# Altium footprint library Molex FFC - FPC Connectors (SMT).PcbLib: 638 footprints (part 26 of 40)
Each footprint in its own frame and in the unit in brackets; x right, y up, seen from the top. Pads: shape width x height; smd on the part's side, far side on the other; paste and mask are expansions set on the pad; w line width, h text height; cw(c..) or ccw(c..) is an arc to the next point about the centre after c.
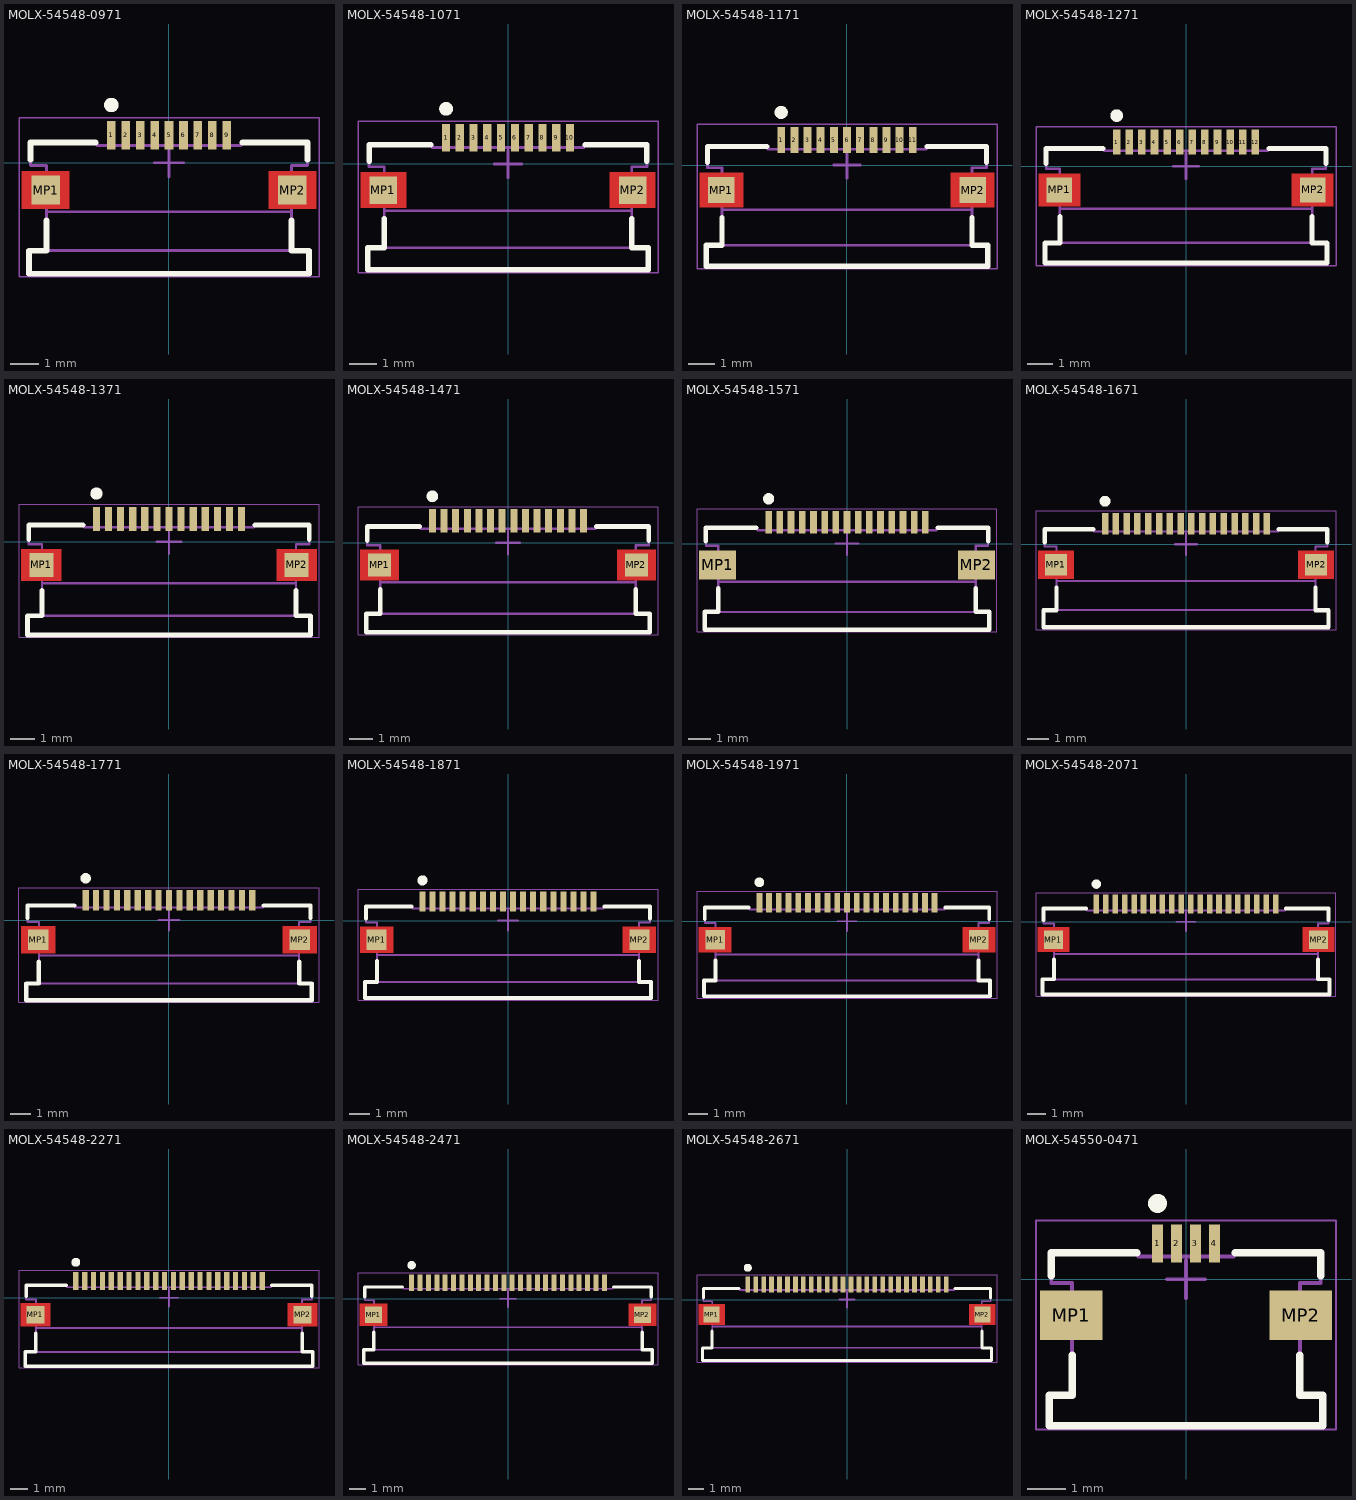
[diagram p25: the footprints below, top view; thin cyan lines are the x and y axes]

## MOLX-54548-0971 [mm] "FPC Connector, 9-Leads, Right Angle, Pitch 0.5 mm, Mated Height 1.2 mm, SMT"
height 1.212
pads (11):
  rect 0.3x1 smd: 1(-2,0.95) 2(-1.5,0.95) 3(-1,0.95) 4(-0.5,0.95) 5(0,0.95) 6(0.5,0.95) 7(1,0.95) 8(1.5,0.95) 9(2,0.95)
  rect 1x1 smd: MP1(-4.275,-0.95) MP2(4.275,-0.95)
Top Layer:
  region: -5.1,-0.3 -3.45,-0.3 -3.45,-1.6 -5.1,-1.6
  region: 5.1,-0.3 3.45,-0.3 3.45,-1.6 5.1,-1.6
Top Overlay:
  circle w0.25: c-2,2 r0.125
  lines w0.2: -4.8,0.1 -4.8,0.7 -2.55,0.7 ; -4.25,-2 -4.25,-3.05 -4.85,-3.05 -4.85,-3.849 4.85,-3.849 4.85,-3.05 4.25,-3.05 4.25,-2 ; 2.55,0.7 4.8,0.7 4.8,0.1
Mechanical 13:
  lines w0.1: -4.25,-1.7 4.25,-1.7 ; -4.25,-3.05 -4.25,-0.1 -4.8,-0.1 -4.8,0.7 -2.5,0.7 -2.5,0.6 2.5,0.6 2.5,0.7 4.8,0.7 4.8,-0.1 4.25,-0.1 4.25,-3.05 ; -4.25,-3.05 -4.85,-3.05 -4.85,-3.849 4.85,-3.849 4.85,-3.05 4.25,-3.05 ; -4.25,-3.05 4.25,-3.05
Mechanical 15:
  lines w0.05: -5.2,-3.949 5.2,-3.949 5.2,1.55 -5.2,1.55 -5.2,-3.949
  lines w0.1: -0.5,0 0.5,0 ; 0,-0.5 0,0.5
3D body: height 0.25, standoff 0, extent -4.85,-3.849 4.85,1.151

## MOLX-54548-1071 [mm] "FPC Connector, 10-Leads, Right Angle, Pitch 0.5 mm, Mated Height 1.2 mm, SMT"
height 1.212
pads (12):
  rect 0.3x1 smd: 1(-2.25,0.95) 2(-1.75,0.95) 3(-1.25,0.95) 4(-0.75,0.95) 5(-0.25,0.95) 6(0.25,0.95) 7(0.75,0.95) 8(1.25,0.95) 9(1.75,0.95) 10(2.25,0.95)
  rect 1x1 smd: MP1(-4.525,-0.95) MP2(4.525,-0.95)
Top Layer:
  region: -5.35,-0.3 -3.7,-0.3 -3.7,-1.6 -5.35,-1.6
  region: 5.35,-0.3 3.7,-0.3 3.7,-1.6 5.35,-1.6
Top Overlay:
  circle w0.25: c-2.25,2 r0.125
  lines w0.2: -5.05,0.1 -5.05,0.7 -2.8,0.7 ; -4.5,-2 -4.5,-3.05 -5.1,-3.05 -5.1,-3.849 5.1,-3.849 5.1,-3.05 4.5,-3.05 4.5,-2 ; 2.8,0.7 5.05,0.7 5.05,0.1
Mechanical 13:
  lines w0.1: -4.5,-1.7 4.5,-1.7 ; -4.5,-3.05 4.5,-3.05 ; -4.5,-3.05 -5.1,-3.05 -5.1,-3.849 5.1,-3.849 5.1,-3.05 4.5,-3.05 ; -4.5,-3.05 -4.5,-0.1 -5.05,-0.1 -5.05,0.7 -2.75,0.7 -2.75,0.6 2.75,0.6 2.75,0.7 5.05,0.7 5.05,-0.1 4.5,-0.1 4.5,-3.05
Mechanical 15:
  lines w0.05: -5.45,-3.949 -5.45,1.55 5.45,1.55 5.45,-3.949 -5.45,-3.949
  lines w0.1: -0.5,0 0.5,0 ; 0,-0.5 0,0.5
3D body: height 0.25, standoff 0, extent -5.1,-3.85 5.1,1.15

## MOLX-54548-1171 [mm] "FPC Connector, 11-Leads, Right Angle, Pitch 0.5 mm, Mated Height 1.2 mm, SMT"
height 1.212
pads (13):
  rect 0.3x1 smd: 1(-2.5,0.95) 2(-2,0.95) 3(-1.5,0.95) 4(-1,0.95) 5(-0.5,0.95) 6(0,0.95) 7(0.5,0.95) 8(1,0.95) 9(1.5,0.95) 10(2,0.95) 11(2.5,0.95)
  rect 1x1 smd: MP1(-4.775,-0.95) MP2(4.775,-0.95)
Top Layer:
  region: 5.6,-0.3 3.95,-0.3 3.95,-1.6 5.6,-1.6
  region: -5.6,-0.3 -3.95,-0.3 -3.95,-1.6 -5.6,-1.6
Top Overlay:
  circle w0.25: c-2.5,2 r0.125
  lines w0.2: -5.3,0.1 -5.3,0.7 -3.05,0.7 ; -4.75,-2 -4.75,-3.05 -5.35,-3.05 -5.35,-3.849 5.35,-3.849 5.35,-3.05 4.75,-3.05 4.75,-2 ; 3.05,0.7 5.3,0.7 5.3,0.1
Mechanical 13:
  lines w0.1: -4.75,-1.7 4.75,-1.7 ; -4.75,-3.05 4.75,-3.05 ; -4.75,-3.05 -5.35,-3.05 -5.35,-3.849 5.35,-3.849 5.35,-3.05 4.75,-3.05 ; -4.75,-3.05 -4.75,-0.1 -5.3,-0.1 -5.3,0.7 -3,0.7 -3,0.6 3,0.6 3,0.7 5.3,0.7 5.3,-0.1 4.75,-0.1 4.75,-3.05
Mechanical 15:
  lines w0.05: -5.7,-3.949 -5.7,1.55 5.7,1.55 5.7,-3.949 -5.7,-3.949
  lines w0.1: -0.5,0 0.5,0 ; 0,-0.5 0,0.5
3D body: height 0.25, standoff 0, extent -5.35,-3.849 5.35,1.151

## MOLX-54548-1271 [mm] "FPC Connector, 12-Leads, Right Angle, Pitch 0.5 mm, Mated Height 1.2 mm, SMT"
height 1.212
pads (14):
  rect 0.3x1 smd: 1(-2.75,0.95) 2(-2.25,0.95) 3(-1.75,0.95) 4(-1.25,0.95) 5(-0.75,0.95) 6(-0.25,0.95) 7(0.25,0.95) 8(0.75,0.95) 9(1.25,0.95) 10(1.75,0.95) 11(2.25,0.95) 12(2.75,0.95)
  rect 1x1 smd: MP1(-5.025,-0.95) MP2(5.025,-0.95)
Top Layer:
  region: 5.85,-0.3 4.2,-0.3 4.2,-1.6 5.85,-1.6
  region: -5.85,-0.3 -4.2,-0.3 -4.2,-1.6 -5.85,-1.6
Top Overlay:
  circle w0.25: c-2.75,2 r0.125
  lines w0.2: -5.55,0.1 -5.55,0.7 -3.3,0.7 ; -5,-2 -5,-3.05 -5.6,-3.05 -5.6,-3.849 5.6,-3.849 5.6,-3.05 5,-3.05 5,-2 ; 3.3,0.7 5.55,0.7 5.55,0.1
Mechanical 13:
  lines w0.1: -5,-1.7 5,-1.7 ; -5,-3.05 -5,-0.1 -5.55,-0.1 -5.55,0.7 -3.25,0.7 -3.25,0.6 3.25,0.6 3.25,0.7 5.55,0.7 5.55,-0.1 5,-0.1 5,-3.05 ; -5,-3.05 -5.6,-3.05 -5.6,-3.849 5.6,-3.849 5.6,-3.05 5,-3.05 ; -5,-3.05 5,-3.05
Mechanical 15:
  lines w0.05: -5.95,-3.949 5.95,-3.949 5.95,1.55 -5.95,1.55 -5.95,-3.949
  lines w0.1: -0.5,0 0.5,0 ; 0,-0.5 0,0.5
3D body: height 0.25, standoff 0, extent -5.6,-3.85 5.6,1.15

## MOLX-54548-1371 [mm] "FPC Connector, 13-Leads, Right Angle, Pitch 0.5 mm, Mated Height 1.2 mm, SMT"
height 1.212
pads (15):
  rect 0.3x1 smd: 1(-3,0.95) 2(-2.5,0.95) 3(-2,0.95) 4(-1.5,0.95) 5(-1,0.95) 6(-0.5,0.95) 7(0,0.95) 8(0.5,0.95) 9(1,0.95) 10(1.5,0.95) 11(2,0.95) 12(2.5,0.95) 13(3,0.95)
  rect 1x1 smd: MP1(-5.275,-0.95) MP2(5.275,-0.95)
Top Layer:
  region: 6.1,-0.3 4.45,-0.3 4.45,-1.6 6.1,-1.6
  region: -6.1,-0.3 -4.45,-0.3 -4.45,-1.6 -6.1,-1.6
Top Overlay:
  circle w0.25: c-3,2 r0.125
  lines w0.2: -5.8,0.1 -5.8,0.7 -3.55,0.7 ; -5.25,-2 -5.25,-3.05 -5.85,-3.05 -5.85,-3.849 5.85,-3.849 5.85,-3.05 5.25,-3.05 5.25,-2 ; 3.55,0.7 5.8,0.7 5.8,0.1
Mechanical 13:
  lines w0.1: -5.25,-1.7 5.25,-1.7 ; -5.25,-3.05 5.25,-3.05 ; -5.25,-3.05 -5.85,-3.05 -5.85,-3.849 5.85,-3.849 5.85,-3.05 5.25,-3.05 ; -5.25,-3.05 -5.25,-0.1 -5.8,-0.1 -5.8,0.7 -3.5,0.7 -3.5,0.6 3.5,0.6 3.5,0.7 5.8,0.7 5.8,-0.1 5.25,-0.1 5.25,-3.05
Mechanical 15:
  lines w0.05: -6.2,-3.949 -6.2,1.55 6.2,1.55 6.2,-3.949 -6.2,-3.949
  lines w0.1: -0.5,0 0.5,0 ; 0,-0.5 0,0.5
3D body: height 0.25, standoff 0, extent -5.85,-3.849 5.85,1.151

## MOLX-54548-1471 [mm] "FPC Connector, 14-Leads, Right Angle, Pitch 0.5 mm, Mated Height 1.2 mm, SMT"
height 1.212
pads (16):
  rect 0.3x1 smd: 1(-3.25,0.95) 2(-2.75,0.95) 3(-2.25,0.95) 4(-1.75,0.95) 5(-1.25,0.95) 6(-0.75,0.95) 7(-0.25,0.95) 8(0.25,0.95) 9(0.75,0.95) 10(1.25,0.95) 11(1.75,0.95) 12(2.25,0.95) 13(2.75,0.95) 14(3.25,0.95)
  rect 1x1 smd: MP1(-5.525,-0.95) MP2(5.525,-0.95)
Top Layer:
  region: -6.35,-0.3 -4.7,-0.3 -4.7,-1.6 -6.35,-1.6
  region: 6.35,-0.3 4.7,-0.3 4.7,-1.6 6.35,-1.6
Top Overlay:
  circle w0.25: c-3.25,2 r0.125
  lines w0.2: -6.05,0.1 -6.05,0.7 -3.8,0.7 ; -5.5,-2 -5.5,-3.05 -6.1,-3.05 -6.1,-3.849 6.1,-3.849 6.1,-3.05 5.5,-3.05 5.5,-2 ; 3.8,0.7 6.05,0.7 6.05,0.1
Mechanical 13:
  lines w0.1: -5.5,-1.7 5.5,-1.7 ; -5.5,-3.05 -5.5,-0.1 -6.05,-0.1 -6.05,0.7 -3.75,0.7 -3.75,0.6 3.75,0.6 3.75,0.7 6.05,0.7 6.05,-0.1 5.5,-0.1 5.5,-3.05 ; -5.5,-3.05 -6.1,-3.05 -6.1,-3.849 6.1,-3.849 6.1,-3.05 5.5,-3.05 ; -5.5,-3.05 5.5,-3.05
Mechanical 15:
  lines w0.05: -6.45,-3.949 6.45,-3.949 6.45,1.55 -6.45,1.55 -6.45,-3.949
  lines w0.1: -0.5,0 0.5,0 ; 0,-0.5 0,0.5
3D body: height 0.25, standoff 0, extent -6.1,-3.85 6.1,1.15

## MOLX-54548-1571 [mm] "FPC Connector, 15-Leads, Right Angle, Pitch 0.5 mm, Mated Height 1.2 mm, SMT"
height 1.212
pads (17):
  rect 0.3x1 smd: 1(-3.5,0.95) 2(-3,0.95) 3(-2.5,0.95) 4(-2,0.95) 5(-1.5,0.95) 6(-1,0.95) 7(-0.5,0.95) 8(0,0.95) 9(0.5,0.95) 10(1,0.95) 11(1.5,0.95) 12(2,0.95) 13(2.5,0.95) 14(3,0.95) 15(3.5,0.95)
  rect 1.65x1.3 smd: MP1(-5.775,-0.95) MP2(5.775,-0.95)
Top Overlay:
  circle w0.25: c-3.5,2 r0.125
  lines w0.2: -6.3,0.1 -6.3,0.7 -4.05,0.7 ; -5.75,-2 -5.75,-3.05 -6.35,-3.05 -6.35,-3.849 6.35,-3.849 6.35,-3.05 5.75,-3.05 5.75,-2 ; 4.05,0.7 6.3,0.7 6.3,0.1
Mechanical 13:
  lines w0.1: -5.75,-1.7 5.75,-1.7 ; -5.75,-3.05 5.75,-3.05 ; -5.75,-3.05 -6.35,-3.05 -6.35,-3.849 6.35,-3.849 6.35,-3.05 5.75,-3.05 ; -5.75,-3.05 -5.75,-0.1 -6.3,-0.1 -6.3,0.7 -4,0.7 -4,0.6 4,0.6 4,0.7 6.3,0.7 6.3,-0.1 5.75,-0.1 5.75,-3.05
Mechanical 15:
  lines w0.05: -6.7,-3.949 -6.7,1.55 6.7,1.55 6.7,-3.949 -6.7,-3.949
  lines w0.1: -0.5,0 0.5,0 ; 0,-0.5 0,0.5
3D body: height 0.25, standoff 0, extent -6.35,-3.849 6.35,1.151

## MOLX-54548-1671 [mm] "FPC Connector, 16-Leads, Right Angle, Pitch 0.5 mm, Mated Height 1.2 mm, SMT"
height 1.212
pads (18):
  rect 0.3x1 smd: 1(-3.75,0.95) 2(-3.25,0.95) 3(-2.75,0.95) 4(-2.25,0.95) 5(-1.75,0.95) 6(-1.25,0.95) 7(-0.75,0.95) 8(-0.25,0.95) 9(0.25,0.95) 10(0.75,0.95) 11(1.25,0.95) 12(1.75,0.95) 13(2.25,0.95) 14(2.75,0.95) 15(3.25,0.95) 16(3.75,0.95)
  rect 1x1 smd: MP1(-6.025,-0.95) MP2(6.025,-0.95)
Top Layer:
  region: 6.85,-0.3 5.2,-0.3 5.2,-1.6 6.85,-1.6
  region: -6.85,-0.3 -5.2,-0.3 -5.2,-1.6 -6.85,-1.6
Top Overlay:
  circle w0.25: c-3.75,2 r0.125
  lines w0.2: -6.55,0.1 -6.55,0.7 -4.3,0.7 ; -6,-2 -6,-3.05 -6.6,-3.05 -6.6,-3.849 6.6,-3.849 6.6,-3.05 6,-3.05 6,-2 ; 4.3,0.7 6.55,0.7 6.55,0.1
Mechanical 13:
  lines w0.1: -6,-1.7 6,-1.7 ; -6,-3.05 -6,-0.1 -6.55,-0.1 -6.55,0.7 -4.25,0.7 -4.25,0.6 4.25,0.6 4.25,0.7 6.55,0.7 6.55,-0.1 6,-0.1 6,-3.05 ; -6,-3.05 -6.6,-3.05 -6.6,-3.849 6.6,-3.849 6.6,-3.05 6,-3.05 ; -6,-3.05 6,-3.05
Mechanical 15:
  lines w0.05: -6.95,-3.949 6.95,-3.949 6.95,1.55 -6.95,1.55 -6.95,-3.949
  lines w0.1: -0.5,0 0.5,0 ; 0,-0.5 0,0.5
3D body: height 0.25, standoff 0, extent -6.6,-3.85 6.6,1.15

## MOLX-54548-1771 [mm] "FPC Connector, 17-Leads, Right Angle, Pitch 0.5 mm, Mated Height 1.2 mm, SMT"
height 1.212
pads (19):
  rect 0.3x1 smd: 1(-4,0.95) 2(-3.5,0.95) 3(-3,0.95) 4(-2.5,0.95) 5(-2,0.95) 6(-1.5,0.95) 7(-1,0.95) 8(-0.5,0.95) 9(0,0.95) 10(0.5,0.95) 11(1,0.95) 12(1.5,0.95) 13(2,0.95) 14(2.5,0.95) 15(3,0.95) 16(3.5,0.95) 17(4,0.95)
  rect 1x1 smd: MP1(-6.275,-0.95) MP2(6.275,-0.95)
Top Layer:
  region: 7.1,-0.3 5.45,-0.3 5.45,-1.6 7.1,-1.6
  region: -7.1,-0.3 -5.45,-0.3 -5.45,-1.6 -7.1,-1.6
Top Overlay:
  circle w0.25: c-4,2 r0.125
  lines w0.2: -6.8,0.1 -6.8,0.7 -4.55,0.7 ; -6.25,-2 -6.25,-3.05 -6.85,-3.05 -6.85,-3.849 6.85,-3.849 6.85,-3.05 6.25,-3.05 6.25,-2 ; 4.55,0.7 6.8,0.7 6.8,0.1
Mechanical 13:
  lines w0.1: -6.25,-1.7 6.25,-1.7 ; -6.25,-3.05 6.25,-3.05 ; -6.25,-3.05 -6.85,-3.05 -6.85,-3.849 6.85,-3.849 6.85,-3.05 6.25,-3.05 ; -6.25,-3.05 -6.25,-0.1 -6.8,-0.1 -6.8,0.7 -4.5,0.7 -4.5,0.6 4.5,0.6 4.5,0.7 6.8,0.7 6.8,-0.1 6.25,-0.1 6.25,-3.05
Mechanical 15:
  lines w0.05: -7.2,-3.949 -7.2,1.55 7.2,1.55 7.2,-3.949 -7.2,-3.949
  lines w0.1: -0.5,0 0.5,0 ; 0,-0.5 0,0.5
3D body: height 0.25, standoff 0, extent -6.85,-3.849 6.85,1.151

## MOLX-54548-1871 [mm] "FPC Connector, 18-Leads, Right Angle, Pitch 0.5 mm, Mated Height 1.2 mm, SMT"
height 1.212
pads (20):
  rect 0.3x1 smd: 1(-4.25,0.95) 2(-3.75,0.95) 3(-3.25,0.95) 4(-2.75,0.95) 5(-2.25,0.95) 6(-1.75,0.95) 7(-1.25,0.95) 8(-0.75,0.95) 9(-0.25,0.95) 10(0.25,0.95) 11(0.75,0.95) 12(1.25,0.95) 13(1.75,0.95) 14(2.25,0.95) 15(2.75,0.95) 16(3.25,0.95) 17(3.75,0.95) 18(4.25,0.95)
  rect 1x1 smd: MP1(-6.525,-0.95) MP2(6.525,-0.95)
Top Layer:
  region: 7.35,-0.3 5.7,-0.3 5.7,-1.6 7.35,-1.6
  region: -7.35,-0.3 -5.7,-0.3 -5.7,-1.6 -7.35,-1.6
Top Overlay:
  circle w0.25: c-4.25,2 r0.125
  lines w0.2: -7.05,0.1 -7.05,0.7 -4.8,0.7 ; -6.5,-2 -6.5,-3.05 -7.1,-3.05 -7.1,-3.849 7.1,-3.849 7.1,-3.05 6.5,-3.05 6.5,-2 ; 4.8,0.7 7.05,0.7 7.05,0.1
Mechanical 13:
  lines w0.1: -7.1,-3.849 -7.1,-3.05 -6.5,-3.05 ; -7.1,-3.849 7.1,-3.849 7.1,-3.05 6.5,-3.05 ; -6.5,-1.7 6.5,-1.7 ; -6.5,-3.05 -6.5,-0.1 -7.05,-0.1 -7.05,0.7 -4.75,0.7 -4.75,0.6 4.75,0.6 4.75,0.7 7.05,0.7 7.05,-0.1 6.5,-0.1 6.5,-3.05 ; -6.5,-3.05 6.5,-3.05
Mechanical 15:
  lines w0.05: -7.45,-3.949 7.45,-3.949 7.45,1.55 -7.45,1.55 -7.45,-3.949
  lines w0.1: -0.5,0 0.5,0 ; 0,-0.5 0,0.5
3D body: height 0.25, standoff 0, extent -7.1,-3.85 7.1,1.15

## MOLX-54548-1971 [mm] "FPC Connector, 19-Leads, Right Angle, Pitch 0.5 mm, Mated Height 1.2 mm, SMT"
height 1.212
pads (21):
  rect 0.3x1 smd: 1(-4.5,0.95) 2(-4,0.95) 3(-3.5,0.95) 4(-3,0.95) 5(-2.5,0.95) 6(-2,0.95) 7(-1.5,0.95) 8(-1,0.95) 9(-0.5,0.95) 10(0,0.95) 11(0.5,0.95) 12(1,0.95) 13(1.5,0.95) 14(2,0.95) 15(2.5,0.95) 16(3,0.95) 17(3.5,0.95) 18(4,0.95) 19(4.5,0.95)
  rect 1x1 smd: MP1(-6.775,-0.95) MP2(6.775,-0.95)
Top Layer:
  region: -7.6,-0.3 -5.95,-0.3 -5.95,-1.6 -7.6,-1.6
  region: 7.6,-0.3 5.95,-0.3 5.95,-1.6 7.6,-1.6
Top Overlay:
  circle w0.25: c-4.5,2 r0.125
  lines w0.2: -7.3,0.1 -7.3,0.7 -5.05,0.7 ; -6.75,-2 -6.75,-3.05 -7.35,-3.05 -7.35,-3.849 7.35,-3.849 7.35,-3.05 6.75,-3.05 6.75,-2 ; 5.05,0.7 7.3,0.7 7.3,0.1
Mechanical 13:
  lines w0.1: -6.75,-1.7 6.75,-1.7 ; -6.75,-3.05 -6.75,-0.1 -7.3,-0.1 -7.3,0.7 -5,0.7 -5,0.6 5,0.6 5,0.7 7.3,0.7 7.3,-0.1 6.75,-0.1 6.75,-3.05 ; -6.75,-3.05 -7.35,-3.05 -7.35,-3.849 7.35,-3.849 7.35,-3.05 6.75,-3.05 ; -6.75,-3.05 6.75,-3.05
Mechanical 15:
  lines w0.05: -7.7,-3.949 7.7,-3.949 7.7,1.55 -7.7,1.55 -7.7,-3.949
  lines w0.1: -0.5,0 0.5,0 ; 0,-0.5 0,0.5
3D body: height 0.25, standoff 0, extent -7.35,-3.849 7.35,1.151

## MOLX-54548-2071 [mm] "FPC Connector, 20-Leads, Right Angle, Pitch 0.5 mm, Mated Height 1.2 mm, SMT"
height 1.212
pads (22):
  rect 0.3x1 smd: 1(-4.75,0.95) 2(-4.25,0.95) 3(-3.75,0.95) 4(-3.25,0.95) 5(-2.75,0.95) 6(-2.25,0.95) 7(-1.75,0.95) 8(-1.25,0.95) 9(-0.75,0.95) 10(-0.25,0.95) 11(0.25,0.95) 12(0.75,0.95) 13(1.25,0.95) 14(1.75,0.95) 15(2.25,0.95) 16(2.75,0.95) 17(3.25,0.95) 18(3.75,0.95) 19(4.25,0.95) 20(4.75,0.95)
  rect 1x1 smd: MP1(-7.025,-0.95) MP2(7.025,-0.95)
Top Layer:
  region: -7.85,-0.3 -6.2,-0.3 -6.2,-1.6 -7.85,-1.6
  region: 7.85,-0.3 6.2,-0.3 6.2,-1.6 7.85,-1.6
Top Overlay:
  circle w0.25: c-4.75,2 r0.125
  lines w0.2: -7.55,0.1 -7.55,0.7 -5.3,0.7 ; -7,-2 -7,-3.05 -7.6,-3.05 -7.6,-3.849 7.6,-3.849 7.6,-3.05 7,-3.05 7,-2 ; 5.3,0.7 7.55,0.7 7.55,0.1
Mechanical 13:
  lines w0.1: -7,-1.7 7,-1.7 ; -7,-3.05 7,-3.05 ; -7,-3.05 -7.6,-3.05 -7.6,-3.849 7.6,-3.849 7.6,-3.05 7,-3.05 ; -7,-3.05 -7,-0.1 -7.55,-0.1 -7.55,0.7 -5.25,0.7 -5.25,0.6 5.25,0.6 5.25,0.7 7.55,0.7 7.55,-0.1 7,-0.1 7,-3.05
Mechanical 15:
  lines w0.05: -7.95,-3.949 -7.95,1.55 7.95,1.55 7.95,-3.949 -7.95,-3.949
  lines w0.1: -0.5,0 0.5,0 ; 0,-0.5 0,0.5
3D body: height 0.25, standoff 0, extent -7.6,-3.849 7.6,1.151

## MOLX-54548-2271 [mm] "FPC Connector, 22-Leads, Right Angle, Pitch 0.5 mm, Mated Height 1.2 mm, SMT"
height 1.212
pads (24):
  rect 0.3x1 smd: 1(-5.25,0.95) 2(-4.75,0.95) 3(-4.25,0.95) 4(-3.75,0.95) 5(-3.25,0.95) 6(-2.75,0.95) 7(-2.25,0.95) 8(-1.75,0.95) 9(-1.25,0.95) 10(-0.75,0.95) 11(-0.25,0.95) 12(0.25,0.95) 13(0.75,0.95) 14(1.25,0.95) 15(1.75,0.95) 16(2.25,0.95) 17(2.75,0.95) 18(3.25,0.95) 19(3.75,0.95) 20(4.25,0.95) 21(4.75,0.95) 22(5.25,0.95)
  rect 1x1 smd: MP1(-7.525,-0.95) MP2(7.525,-0.95)
Top Layer:
  region: 8.35,-0.3 6.7,-0.3 6.7,-1.6 8.35,-1.6
  region: -8.35,-0.3 -6.7,-0.3 -6.7,-1.6 -8.35,-1.6
Top Overlay:
  circle w0.25: c-5.25,2 r0.125
  lines w0.2: -8.05,0.1 -8.05,0.7 -5.8,0.7 ; -7.5,-2 -7.5,-3.05 -8.1,-3.05 -8.1,-3.849 8.1,-3.849 8.1,-3.05 7.5,-3.05 7.5,-2 ; 5.8,0.7 8.05,0.7 8.05,0.1
Mechanical 13:
  lines w0.1: -7.5,-1.7 7.5,-1.7 ; -7.5,-3.05 -7.5,-0.1 -8.05,-0.1 -8.05,0.7 -5.75,0.7 -5.75,0.6 5.75,0.6 5.75,0.7 8.05,0.7 8.05,-0.1 7.5,-0.1 7.5,-3.05 ; -7.5,-3.05 -8.1,-3.05 -8.1,-3.849 8.1,-3.849 8.1,-3.05 7.5,-3.05 ; -7.5,-3.05 7.5,-3.05
Mechanical 15:
  lines w0.05: -8.45,-3.949 8.45,-3.949 8.45,1.55 -8.45,1.55 -8.45,-3.949
  lines w0.1: -0.5,0 0.5,0 ; 0,-0.5 0,0.5
3D body: height 0.25, standoff 0, extent -8.1,-3.849 8.1,1.151

## MOLX-54548-2471 [mm] "FPC Connector, 24-Leads, Right Angle, Pitch 0.5 mm, Mated Height 1.2 mm, SMT"
height 1.212
pads (26):
  rect 0.3x1 smd: 1(-5.75,0.95) 2(-5.25,0.95) 3(-4.75,0.95) 4(-4.25,0.95) 5(-3.75,0.95) 6(-3.25,0.95) 7(-2.75,0.95) 8(-2.25,0.95) 9(-1.75,0.95) 10(-1.25,0.95) 11(-0.75,0.95) 12(-0.25,0.95) 13(0.25,0.95) 14(0.75,0.95) 15(1.25,0.95) 16(1.75,0.95) 17(2.25,0.95) 18(2.75,0.95) 19(3.25,0.95) 20(3.75,0.95) 21(4.25,0.95) 22(4.75,0.95) 23(5.25,0.95) 24(5.75,0.95)
  rect 1x1 smd: MP1(-8.025,-0.95) MP2(8.025,-0.95)
Top Layer:
  region: -8.85,-0.3 -7.2,-0.3 -7.2,-1.6 -8.85,-1.6
  region: 8.85,-0.3 7.2,-0.3 7.2,-1.6 8.85,-1.6
Top Overlay:
  circle w0.25: c-5.75,2 r0.125
  lines w0.2: -8.55,0.1 -8.55,0.7 -6.3,0.7 ; -8,-2 -8,-3.05 -8.6,-3.05 -8.6,-3.849 8.6,-3.849 8.6,-3.05 8,-3.05 8,-2 ; 6.3,0.7 8.55,0.7 8.55,0.1
Mechanical 13:
  lines w0.1: -8,-1.7 8,-1.7 ; -8,-3.05 8,-3.05 ; -8,-3.05 -8.6,-3.05 -8.6,-3.849 8.6,-3.849 8.6,-3.05 8,-3.05 ; -8,-3.05 -8,-0.1 -8.55,-0.1 -8.55,0.7 -6.25,0.7 -6.25,0.6 6.25,0.6 6.25,0.7 8.55,0.7 8.55,-0.1 8,-0.1 8,-3.05
Mechanical 15:
  lines w0.05: -8.95,-3.949 -8.95,1.55 8.95,1.55 8.95,-3.949 -8.95,-3.949
  lines w0.1: -0.5,0 0.5,0 ; 0,-0.5 0,0.5
3D body: height 0.25, standoff 0, extent -8.6,-3.849 8.6,1.151

## MOLX-54548-2671 [mm] "FPC Connector, 26-Leads, Right Angle, Pitch 0.5 mm, Mated Height 1.2 mm, SMT"
height 1.212
pads (28):
  rect 0.3x1 smd: 1(-6.25,0.95) 2(-5.75,0.95) 3(-5.25,0.95) 4(-4.75,0.95) 5(-4.25,0.95) 6(-3.75,0.95) 7(-3.25,0.95) 8(-2.75,0.95) 9(-2.25,0.95) 10(-1.75,0.95) 11(-1.25,0.95) 12(-0.75,0.95) 13(-0.25,0.95) 14(0.25,0.95) 15(0.75,0.95) 16(1.25,0.95) 17(1.75,0.95) 18(2.25,0.95) 19(2.75,0.95) 20(3.25,0.95) 21(3.75,0.95) 22(4.25,0.95) 23(4.75,0.95) 24(5.25,0.95) 25(5.75,0.95) 26(6.25,0.95)
  rect 1x1 smd: MP1(-8.525,-0.95) MP2(8.525,-0.95)
Top Layer:
  region: -9.35,-0.3 -7.7,-0.3 -7.7,-1.6 -9.35,-1.6
  region: 9.35,-0.3 7.7,-0.3 7.7,-1.6 9.35,-1.6
Top Overlay:
  circle w0.25: c-6.25,2 r0.125
  lines w0.2: -9.05,0.1 -9.05,0.7 -6.8,0.7 ; -8.5,-2 -8.5,-3.05 -9.1,-3.05 -9.1,-3.849 9.1,-3.849 9.1,-3.05 8.5,-3.05 8.5,-2 ; 6.8,0.7 9.05,0.7 9.05,0.1
Mechanical 13:
  lines w0.1: -8.5,-1.7 8.5,-1.7 ; -8.5,-3.05 8.5,-3.05 ; -8.5,-3.05 -9.1,-3.05 -9.1,-3.849 9.1,-3.849 9.1,-3.05 8.5,-3.05 ; -8.5,-3.05 -8.5,-0.1 -9.05,-0.1 -9.05,0.7 -6.75,0.7 -6.75,0.6 6.75,0.6 6.75,0.7 9.05,0.7 9.05,-0.1 8.5,-0.1 8.5,-3.05
Mechanical 15:
  lines w0.05: -9.45,-3.949 -9.45,1.55 9.45,1.55 9.45,-3.949 -9.45,-3.949
  lines w0.1: -0.5,0 0.5,0 ; 0,-0.5 0,0.5
3D body: height 0.25, standoff 0, extent -9.1,-3.849 9.1,1.151

## MOLX-54550-0471 [mm] "FPC Connector, 4-Leads, Right Angle, Pitch 0.5 mm, Mated Height 1.2 mm, SMT"
height 1.212
pads (6):
  rect 0.3x1 smd: 1(-0.75,0.95) 2(-0.25,0.95) 3(0.25,0.95) 4(0.75,0.95)
  rect 1.65x1.3 smd: MP1(-3.025,-0.95) MP2(3.025,-0.95)
Top Overlay:
  circle w0.25: c-0.75,2 r0.125
  lines w0.2: -3.6,-3.85 -3.6,-3.05 -3,-3.05 -3,-2 ; -3.6,-3.85 3.6,-3.85 3.6,-3.85 3.6,-3.05 3,-3.05 3,-2 ; -3.55,0.1 -3.55,0.7 -1.3,0.7 ; 1.3,0.7 3.55,0.7 3.55,0.1
Mechanical 13:
  lines w0.1: -3.6,-3.85 -3.6,-3.05 -3,-3.05 -3,-0.1 -3.55,-0.1 -3.55,0.7 -1.25,0.7 -1.25,0.6 1.25,0.6 1.25,0.7 3.55,0.7 3.55,-0.1 3,-0.1 3,-3.05 3.6,-3.05 3.6,-3.85 -3.6,-3.85
Mechanical 15:
  lines w0.05: -3.95,-3.95 3.95,-3.95 3.95,1.55 -3.95,1.55 -3.95,-3.95
  lines w0.1: -0.5,0 0.5,0 ; 0,-0.5 0,0.5
3D body: height 0.25, standoff 0, extent -3.6,-3.85 3.6,1.15